# Altium footprint library Mylib.PcbLib: 294 footprints (part 17 of 19)
Each footprint in its own frame and in the unit in brackets; x right, y up, seen from the top. Pads: shape width x height; smd on the part's side, far side on the other; paste and mask are expansions set on the pad; w line width, h text height; cw(c..) or ccw(c..) is an arc to the next point about the centre after c.
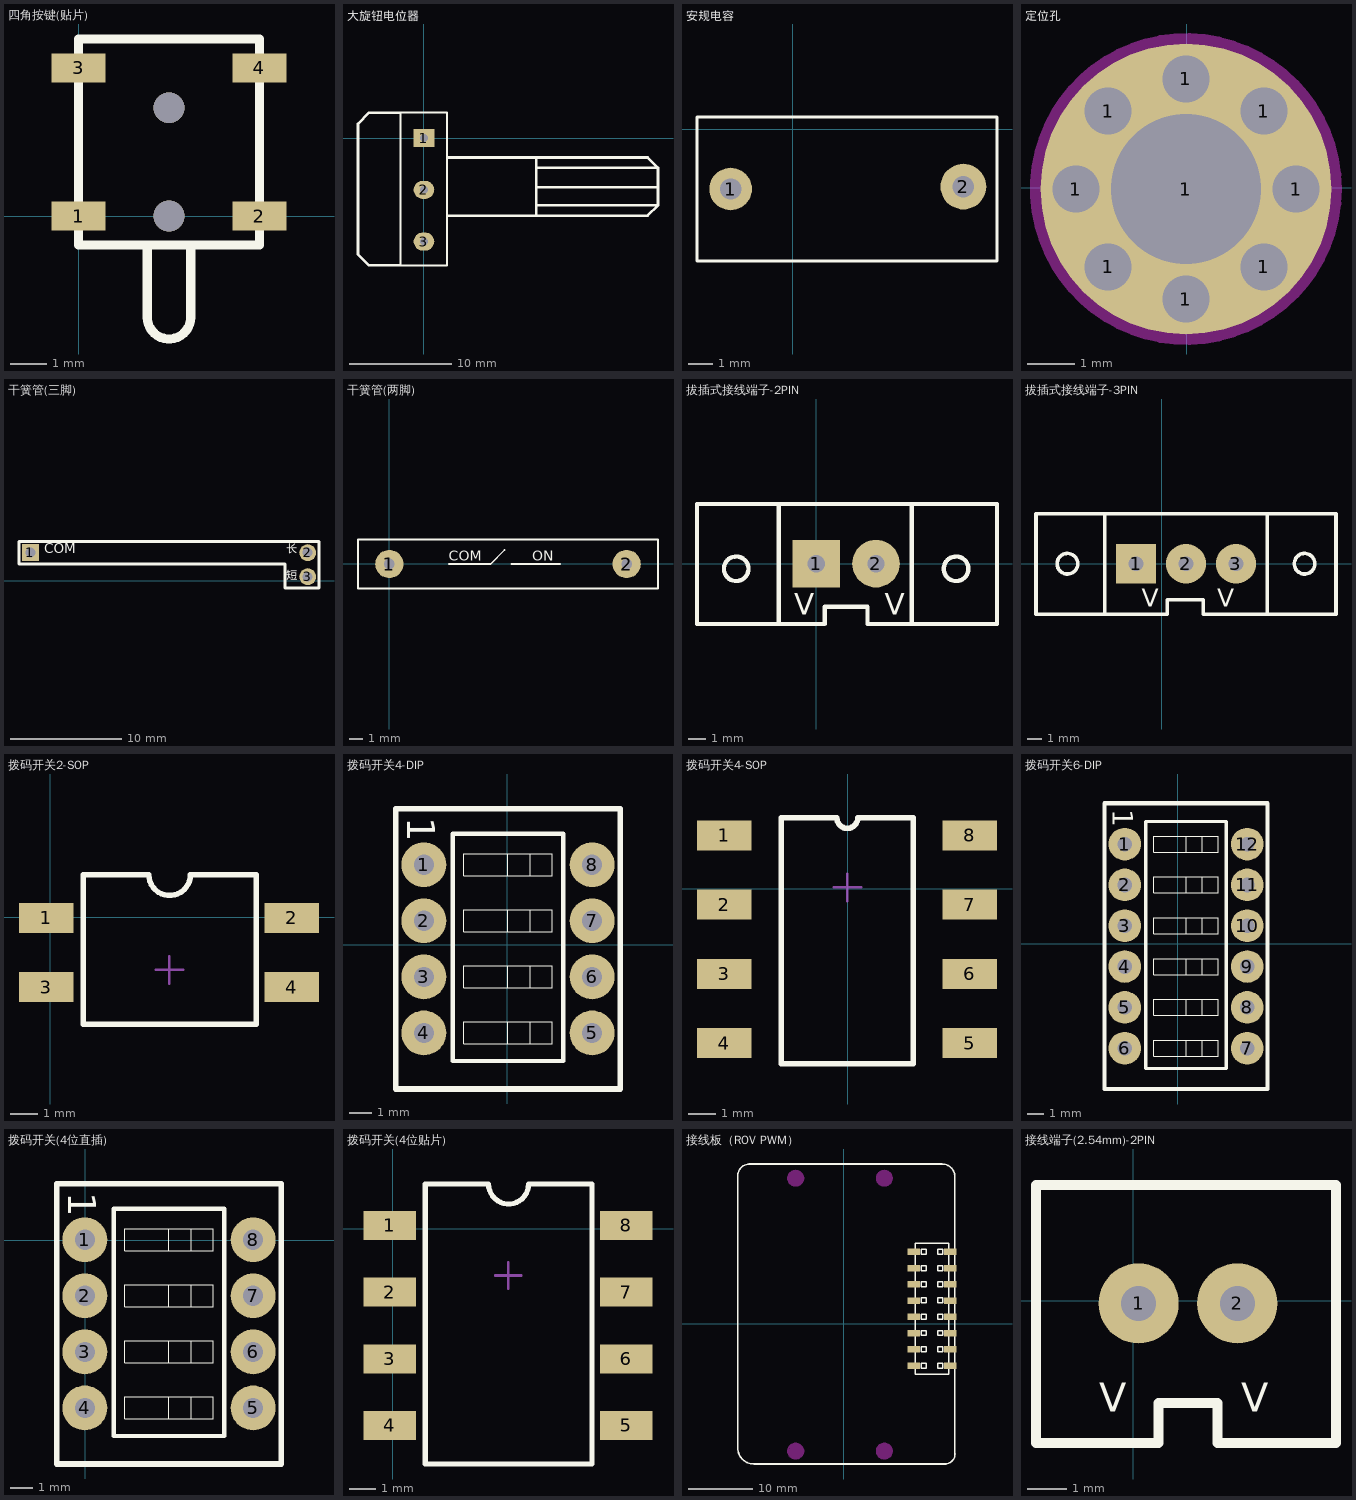
[diagram p16: the footprints below, top view; thin cyan lines are the x and y axes]

## 四角按键(贴片) [mm]
pads (4):
  rect 1.5x0.8 smd: 1(0,0) 2(5,0) 3(0,4.1) 4(5,4.1)
via 2.5,3 diameter 0.85 hole 0.85
via 2.5,0 diameter 0.85 hole 0.85
Top Overlay:
  lines w0.254: 1.9,-0.8 1.9,-2.8 ccw(c2.5,-2.8) 3.1,-2.8 3.1,-0.8 ; 0,-0.8 0,4.9 5,4.9 5,-0.8 0,-0.8
3D body: height 2.5, standoff 0, extent -1.079,-1.243 6.121,5.257

## 大旋钮电位器 [mil]
pads (3):
  rect 80x70 hole 30: 1(0,0)
  oval 80x70 hole 30: 2(0,-200) 3(0,-400)
Top Overlay:
  lines w7.87: -90,-492.13 -90,98.43 90,98.43 90,-492.13 -90,-492.13
  lines w10: -90,-492.13 -212.87,-492.13 -255,-450 -255,55 -211.57,98.43 -90,98.43 ; 90,-300 825,-300 ; 90,-75 865,-75 905,-115 ; 435,-300 435,-75 ; 435,-260 905,-260 ; 435,-190 900,-190 ; 435,-115 905,-115 ; 815,-300 865,-300 905,-260 ; 905,-260 905,-115

## 安规电容 [mm]
pads (2):
  round 1.778 hole 0.889: 1(-2.6,-2.5)
  round 1.905 hole 0.889: 2(7.1,-2.4)
Top Overlay:
  lines w0.127: -4,-5.5 -4,0.5 8.5,0.5 8.5,-5.5 -4,-5.5
3D body "Capacitor 10n - 630V.step": height 10.92, standoff -3, extent -4.155,-4.976 8.595,-0.225

## 定位孔 [mm]
pads (9):
  round 1 hole 1: 1(-2.368,-0.023) 1(-1.679,-1.685) 1(-1.679,1.638) 1(-0.018,-2.373) 1(-0.018,2.327) 1(1.644,-1.685) 1(1.644,1.638) 1(2.332,-0.023)
  round 6.2 hole 3.2: 1(-0.018,-0.023)
Keep-Out Layer:
  circle w0.254: c-0.018,-0.023 r3.2

## 干簧管(三脚) [mil]
pads (3):
  rect 60x60 hole 35: 1(95,100)
  round 60 hole 35: 2(1075,100) 3(1075,15)
Top Overlay:
  lines w10: 55,60 995,60 995,-25 1115,-25 1115,140 55,140 55,60
  text "COM" at 145,85 h60
  text "短" at 1000,-5 h50
  text "长" at 1000,90 h50
3D body: height 44.97, standoff 5.03, extent 813.15,84.9 863.15,124.9
3D body: height 44.97, standoff 5.03, extent 368.15,84.89 418.15,124.89
3D body: height 69.95, standoff -9.95, extent 418.15,65 811.85,144.79

## 干簧管(两脚) [mil]
pads (2):
  round 80 hole 30: 1(0.98,-0.98) 2(670.28,-0.98)
Top Overlay:
  lines w5: 168.31,-0.98 286.42,-0.98 325.79,38.39 ; 345.47,-0.98 483.27,-0.98 ; -87.6,-69.88 -87.6,67.91 758.86,67.91 758.86,-69.88 -87.6,-69.88
  text "ON" at 404.53,-0.98 h50
  text "COM" at 168.31,-0.98 h50
3D body: height 69.92, standoff -9.92, extent 43.31,-40.31 633.86,39.37
3D body: height 44.97, standoff 5.03, extent -8.86,-20.98 41.14,19.02
3D body: height 44.97, standoff 5.03, extent 633.86,-20.47 683.86,19.53

## 拔插式接线端子-2PIN [mil]
pads (2):
  rect 110x110 hole 40: 1(0,0)
  round 110 hole 40: 2(137.8,0)
Top Overlay:
  circle w10: c-185.04,-11.81 r28.39
  circle w10: c322.83,-11.81 r28.39
  lines w10: -86.61,-139.32 -86.61,137.8 ; 220.47,-137.8 220.47,137.8 ; -275.59,-139.32 19.68,-139.32 19.68,-99.32 118.11,-99.32 118.11,-139.32 417.32,-139.32 417.32,137.8 -275.59,137.8 -275.59,-139.32
  text "V" at 157.48,-118.11 h50
  text "V" at -51.18,-118.11 h50
3D body: height 433.07, standoff -78.74, extent -129.92,-157.48 263.78,157.48

## 拔插式接线端子-3PIN [mil]
pads (3):
  rect 110x110 hole 40: 1(-70.87,0)
  round 110 hole 40: 2(66.93,0) 3(204.72,0)
Top Overlay:
  circle w10: c-259.84,0 r28.39
  circle w10: c393.7,0 r28.39
  lines w10: -157.48,-139.32 -157.48,137.8 ; 291.34,-137.8 291.34,137.8 ; -346.46,-139.32 15.75,-139.32 15.75,-99.32 114.17,-99.32 114.17,-139.32 480.31,-139.32 480.31,137.8 -346.46,137.8 -346.46,-139.32
  text "V" at 153.54,-118.11 h50
  text "V" at -55.12,-118.11 h50
3D body: height 433.07, standoff -78.74, extent -236.22,-161.42 354.33,153.54

## 拨码开关2-SOP [mm]
pads (4):
  rect 2x1.1 smd: 1(-0.153,-0.029) 2(8.847,-0.029) 3(-0.153,-2.569) 4(8.847,-2.569)
Top Overlay:
  lines w0.2: 7.525,-3.923 1.195,-3.923 1.195,1.552 3.608,1.552 ccw(c4.37,1.552) 5.132,1.552 7.545,1.552 7.545,-3.925
Mechanical 15:
  lines w0.1: 3.857,-1.934 4.857,-1.934 ; 4.357,-2.434 4.357,-1.434
3D body: height 2.15, standoff 2.05, extent 2.338,-3.274 3.862,-1.75
3D body: height 2.15, standoff 2.05, extent 5.259,-0.734 6.783,0.79
3D body: height 2.05, standoff 2, extent 2.338,-3.274 6.783,-1.75
3D body: height 2.05, standoff 2, extent 2.338,-0.734 6.783,0.79
3D body: height 2, standoff 0, extent 0.925,-3.875 7.783,1.55

## 拨码开关4-DIP [mil]
pads (8):
  round 80 hole 36: 1(-148.7,142.5) 2(-148.7,42.5) 3(-148.7,-57.5) 4(-148.7,-157.5) 5(151.3,-157.5) 6(151.3,-57.5) 7(151.3,42.5) 8(151.3,142.5)
Top Overlay:
  lines w0.98: 1.3,-177.19 1.3,-137.82 ; 1.3,-77.19 1.3,-37.82 ; 1.3,22.81 1.3,62.18 ; 1.3,122.81 1.3,162.18 ; 40.67,-177.19 40.67,-137.82 ; 40.67,-77.19 40.67,-37.82 ; 40.67,22.81 40.67,62.18 ; 40.67,122.81 40.67,162.18 ; -77.44,-177.19 80.04,-177.19 80.04,-137.82 -77.44,-137.82 -77.44,-177.19 ; -77.44,-77.19 80.04,-77.19 80.04,-37.82 -77.44,-37.82 -77.44,-77.19 ; -77.44,22.81 80.04,22.81 80.04,62.18 -77.44,62.18 -77.44,22.81 ; -77.44,122.81 80.04,122.81 80.04,162.18 -77.44,162.18 -77.44,122.81
  lines w7.87: -97.13,-207.5 99.73,-207.5 99.73,197.62 -97.13,197.62 -97.13,-207.5
  lines w10: -198.7,-257.5 -198.7,242.5 201.3,242.5 201.3,-257.5 -198.7,-257.5
  text "1" at -178.7,227.5 h50
3D body: height 275.59, standoff -145.67, extent -195.47,-227.19 194.3,212.19

## 拨码开关4-SOP [mm]
pads (8):
  rect 2x1.1 smd: 1(-4.52,1.958) 2(-4.52,-0.582) 3(-4.52,-3.122) 4(-4.52,-5.662) 5(4.48,-5.662) 6(4.48,-3.122) 7(4.48,-0.582) 8(4.48,1.958)
Top Overlay:
  lines w0.203: -0.405,2.603 -2.423,2.603 -2.423,-6.424 2.403,-6.424 2.403,2.603 0.371,2.603 ; -0.391,2.593 ccw(c-0.01,2.593) 0.371,2.593
Mechanical 15:
  lines w0.1: -0.51,0.053 0.49,0.053 ; -0.01,-0.447 -0.01,0.553

## 拨码开关6-DIP [mil]
pads (12):
  round 80 hole 36: 1(-130.2,243.9) 2(-130.2,143.9) 3(-130.2,43.9) 4(-130.2,-56.1) 5(-130.2,-156.1) 6(-130.2,-256.1) 7(169.8,-256.1) 8(169.8,-156.1) 9(169.8,-56.1) 10(169.8,43.9) 11(169.8,143.9) 12(169.8,243.9)
Top Overlay:
  lines w0.98: 19.8,-275.79 19.8,-236.42 ; 19.8,-175.79 19.8,-136.42 ; 19.8,-75.79 19.8,-36.42 ; 19.8,24.21 19.8,63.58 ; 19.8,124.21 19.8,163.58 ; 19.8,224.21 19.8,263.58 ; 59.17,-275.79 59.17,-236.42 ; 59.17,-175.79 59.17,-136.42 ; 59.17,-75.79 59.17,-36.42 ; 59.17,24.21 59.17,63.58 ; 59.17,124.21 59.17,163.58 ; 59.17,224.21 59.17,263.58 ; -58.94,-275.79 -58.94,-236.42 98.54,-236.42 98.54,-275.79 -58.94,-275.79 ; -58.94,-175.79 -58.94,-136.42 98.54,-136.42 98.54,-175.79 -58.94,-175.79 ; -58.94,-75.79 -58.94,-36.42 98.54,-36.42 98.54,-75.79 -58.94,-75.79 ; -58.94,24.21 -58.94,63.58 98.54,63.58 98.54,24.21 -58.94,24.21 ; -58.94,124.21 -58.94,163.58 98.54,163.58 98.54,124.21 -58.94,124.21 ; -58.94,224.21 -58.94,263.58 98.54,263.58 98.54,224.21 -58.94,224.21
  lines w7.87: -78.63,-306.1 -78.63,299.02 118.23,299.02 118.23,-306.1 -78.63,-306.1
  lines w10: -180.2,-356.1 -180.2,343.9 219.8,343.9 219.8,-356.1 -180.2,-356.1
  text "1" at -160.2,328.9 h50
3D body: height 275.59, standoff -145.67, extent -177.2,-322.79 212.57,316.59

## 拨码开关(4位直插) [mil]
pads (8):
  round 80 hole 36: 1(-1,1) 2(-1,-99) 3(-1,-199) 4(-1,-299) 5(299,-299) 6(299,-199) 7(299,-99) 8(299,1)
Top Overlay:
  lines w0.98: 149,-318.69 149,-279.32 ; 149,-218.69 149,-179.32 ; 149,-118.69 149,-79.32 ; 149,-18.69 149,20.68 ; 188.37,-318.69 188.37,-279.32 ; 188.37,-218.69 188.37,-179.32 ; 188.37,-118.69 188.37,-79.32 ; 188.37,-18.69 188.37,20.68 ; 70.26,-318.69 227.74,-318.69 227.74,-279.32 70.26,-279.32 70.26,-318.69 ; 70.26,-218.69 227.74,-218.69 227.74,-179.32 70.26,-179.32 70.26,-218.69 ; 70.26,-118.69 227.74,-118.69 227.74,-79.32 70.26,-79.32 70.26,-118.69 ; 70.26,-18.69 227.74,-18.69 227.74,20.68 70.26,20.68 70.26,-18.69
  lines w7.87: 50.57,-349 247.43,-349 247.43,56.12 50.57,56.12 50.57,-349
  lines w10: -51,-399 -51,101 349,101 349,-399 -51,-399
  text "1" at -31,86 h50
3D body: height 275.59, standoff -145.67, extent -47.77,-368.69 342,70.69

## 拨码开关(4位贴片) [mm]
pads (8):
  rect 2x1.1 smd: 1(-0.103,0.121) 2(-0.103,-2.419) 3(-0.103,-4.959) 4(-0.103,-7.499) 5(8.897,-7.499) 6(8.897,-4.959) 7(8.897,-2.419) 8(8.897,0.121)
Top Overlay:
  lines w0.2: 1.245,-8.966 7.595,-8.966 7.595,1.702 5.182,1.702 cw(c4.42,1.702) 3.658,1.702 1.245,1.702 1.245,-8.966
Mechanical 15:
  lines w0.1: 3.907,-1.784 4.907,-1.784 ; 4.407,-2.284 4.407,-1.284
3D body: height 2, standoff 0, extent 0.991,-8.712 7.849,1.575
3D body: height 2.05, standoff 2, extent 2.388,-0.584 6.833,0.94
3D body: height 2.05, standoff 2, extent 2.388,-3.124 6.833,-1.6
3D body: height 2.05, standoff 2, extent 2.388,-5.664 6.833,-4.14
3D body: height 2.05, standoff 2, extent 2.388,-8.204 6.833,-6.68
3D body: height 2.15, standoff 2.05, extent 5.309,-0.584 6.833,0.94
3D body: height 2.15, standoff 2.05, extent 2.388,-3.124 3.912,-1.6
3D body: height 2.15, standoff 2.05, extent 5.309,-5.664 6.833,-4.14
3D body: height 2.15, standoff 2.05, extent 5.309,-8.204 6.833,-6.68

## 接线板（ROV PWM） [mm]
pads (16):
  rect 1.9x1.02 smd: 1(16.643,-6.533) 2(10.943,-6.533) 3(16.643,-3.993) 4(10.943,-3.993) 5(16.643,-1.453) 6(10.943,-1.453) 7(16.643,1.087) 8(10.943,1.087) 9(16.643,3.627) 10(10.943,3.627) 11(16.643,6.167) 12(10.943,6.167) 13(16.643,8.707) 14(10.943,8.707) 15(16.643,11.247) 16(10.943,11.247)
Top Overlay:
  lines w0.2: 11.193,-7.873 16.393,-7.873 16.393,12.577 11.193,12.577 11.193,-7.873 ; 12.112,-6.944 12.874,-6.944 12.874,-6.182 12.112,-6.182 12.112,-6.944 ; 12.112,-4.344 12.874,-4.344 12.874,-3.582 12.112,-3.582 12.112,-4.344 ; 12.112,-1.804 12.112,-1.042 12.874,-1.042 12.874,-1.804 12.112,-1.804 ; 12.112,0.736 12.874,0.736 12.874,1.498 12.112,1.498 12.112,0.736 ; 12.112,3.276 12.874,3.276 12.874,4.038 12.112,4.038 12.112,3.276 ; 12.112,5.816 12.874,5.816 12.874,6.578 12.112,6.578 12.112,5.816 ; 12.112,8.296 12.112,9.058 12.874,9.058 12.874,8.296 12.112,8.296 ; 12.112,10.896 12.112,11.658 12.874,11.658 12.874,10.896 12.112,10.896 ; 14.712,-6.944 15.474,-6.944 15.474,-6.182 14.712,-6.182 14.712,-6.944 ; 14.712,-4.344 15.474,-4.344 15.474,-3.582 14.712,-3.582 14.712,-4.344 ; 14.712,-1.804 14.712,-1.042 15.474,-1.042 15.474,-1.804 14.712,-1.804 ; 14.712,0.736 15.474,0.736 15.474,1.498 14.712,1.498 14.712,0.736 ; 14.712,3.276 15.474,3.276 15.474,4.038 14.712,4.038 14.712,3.276 ; 14.712,5.816 15.474,5.816 15.474,6.578 14.712,6.578 14.712,5.816 ; 14.712,8.296 14.712,9.058 15.474,9.058 15.474,8.296 14.712,8.296 ; 14.712,10.896 14.712,11.658 15.474,11.658 15.474,10.896 14.712,10.896
  lines w0.254: -16.545,-19.379 ccw(c-14.043,-19.379) -14.043,-21.881 15.98,-21.881 ccw(c15.808,-20.315) 17.375,-20.142 17.375,22.958 ccw(c15.375,22.958) 15.375,24.958 11.586,24.958 -14.847,24.958 ccw(c-14.696,23.109) -16.545,22.958 -16.545,-19.379
Keep-Out Layer:
  drawing of 8 lines, arcs and shapes, not listed
3D body "TR Fastenings Ltd-M2X7MM.step": height 7.43, standoff 0.43, extent 3.579,20.384 9.121,25.184
3D body "TR Fastenings Ltd-M2X7MM.step": height 7.43, standoff 0.43, extent -10.264,20.409 -4.722,25.209
3D body "TR Fastenings Ltd-M2X7MM.step": height 7.43, standoff 0.43, extent 3.528,-22.237 9.071,-17.437
3D body "TR Fastenings Ltd-M2X7MM.step": height 7.43, standoff 0.43, extent -10.264,-22.263 -4.722,-17.463
3D body "Fe-Header2X1.STEP": height 5.15, standoff 0, extent 10.491,7.377 16.891,9.977
3D body "Fe-Header2X1.STEP": height 5.15, standoff 0, extent 10.491,4.837 16.891,7.437
3D body "Fe-Header2X1.STEP": height 5.15, standoff 0, extent 10.491,-0.243 16.891,2.357
3D body "Fe-Header2X1.STEP": height 5.15, standoff 0, extent 10.491,2.297 16.891,4.897
3D body "Fe-Header2X1.STEP": height 5.15, standoff 0, extent 10.491,-7.863 16.891,-5.263
3D body "Fe-Header2X1.STEP": height 5.15, standoff 0, extent 10.491,-5.323 16.891,-2.723
3D body "Fe-Header2X1.STEP": height 5.15, standoff 0, extent 10.491,-2.783 16.891,-0.183
3D body "Fe-Header2X1.STEP": height 5.15, standoff 0, extent 10.491,9.917 16.891,12.517
3D body "interface.step": height 15.58, standoff 0.01, extent -16.545,-21.922 17.375,24.917

## 接线端子(2.54mm)-2PIN [mil]
pads (2):
  round 80 hole 35: 1(5.42,-2.44) 2(103.84,-2.44)
Top Overlay:
  lines w10: 141.42,-141.76 202.27,-141.76 202.27,115.67 -96.94,115.67 -96.94,-141.76 25.1,-141.76 25.1,-101.76 84.16,-101.76 84.16,-141.76 151.42,-141.76
  text "V" at 107.78,-120.55 h50
  text "V" at -33.95,-120.55 h50
3D body: height 459.84, standoff -140.16, extent -48.52,-139.05 151.48,110.95